# Altium schematic symbol library FPGA_Xilinx_Virtex7.SchLib: 34 symbols (part 21 of 34) (continued)
## XC7VX550T-FFG1158 (continued)
part N pins: AA1 GND (power), AA2 GND (power), AA5 GND (power), AA9 GND (power), AA11 GND (power), AA13 GND (power), AA15 GND (power), AA19 GND (power), AA21 GND (power), AA23 GND (power), AA26 GND (power), AA30 GND (power), AA33 GND (power), AA34 GND (power), AB3 GND (power), AB4 GND (power), AB7 GND (power), AB8 GND (power), AB9 GND (power), AB12 GND (power), AB14 GND (power), AB16 GND (power), AB18 GND (power), AB20 GND (power), AB22 GND (power), AB24 GND (power), AB26 GND (power), AB27 GND (power), AB28 GND (power), AB31 GND (power), AB32 GND (power), AC1 GND (power), AC5 GND (power), AC9 GND (power), AC13 GND (power), AC15 GND (power), AC17 GND (power), AC19 GND (power), AC21 GND (power), AC23 GND (power), AC25 GND (power), AC26 GND (power), AC30 GND (power), AC34 GND (power), AD4 GND (power), AD7 GND (power), AD8 GND (power), AD9 GND (power), AD10 GND (power), AD12 GND (power), AD20 GND (power), AD22 GND (power), AD24 GND (power), AD26 GND (power), AD27 GND (power), AD28 GND (power), AD31 GND (power), AE1 GND (power), AE2 GND (power), AE5 GND (power), AE9 GND (power), AE15 GND (power), AE25 GND (power), AE26 GND (power), AE30 GND (power), AE33 GND (power), AE34 GND (power), AF3 GND (power), AF4 GND (power), AF7 GND (power), AF8 GND (power), AF9 GND (power), AF12 GND (power), AF22 GND (power), AF26 GND (power), AF27 GND (power), AF28 GND (power), AF31 GND (power), AF32 GND (power), AG1 GND (power), AG5 GND (power), AG7 GND (power), AG8 GND (power), AG9 GND (power), AG19 GND (power), AG26 GND (power), AG27 GND (power), AG28 GND (power), AG30 GND (power), AG34 GND (power), AH4 GND (power), AH7 GND (power), AH8 GND (power), AH9 GND (power), AH16 GND (power), AH26 GND (power), AH27 GND (power), AH28 GND (power), AH31 GND (power), AJ1 GND (power), AJ2 GND (power), AJ5 GND (power), AJ7 GND (power), AJ13 GND (power), AJ23 GND (power), AJ28 GND (power), AJ30 GND (power), AJ33 GND (power), AJ34 GND (power), AK3 GND (power), AK4 GND (power), AK7 GND (power), AK10 GND (power), AK20 GND (power), AK28 GND (power), AK31 GND (power), AK32 GND (power), AL1 GND (power), AL5 GND (power), AL7 GND (power), AL17 GND (power), AL27 GND (power), AL28 GND (power), AL30 GND (power), AL34 GND (power), AM4 GND (power), AM7 GND (power), AM14 GND (power), AM24 GND (power), AM28 GND (power), AM31 GND (power), AN1 GND (power), AN2 GND (power), AN5 GND (power), AN7 GND (power), AN11 GND (power), AN21 GND (power), AN28 GND (power), AN30 GND (power), AN33 GND (power), AN34 GND (power), AP3 GND (power), AP4 GND (power), AP7 GND (power), AP8 GND (power), AP18 GND (power), AP28 GND (power), AP31 GND (power), AP32 GND (power), L34 GND (power), M4 GND (power), M7 GND (power), M8 GND (power), M9 GND (power), M14 GND (power), M24 GND (power), M26 GND (power), M27 GND (power), M28 GND (power), M31 GND (power), N1 GND (power), N2 GND (power), N5 GND (power), N9 GND (power), N11 GND (power), N21 GND (power), N26 GND (power), N30 GND (power), N33 GND (power), N34 GND (power), P3 GND (power), P4 GND (power), P7 GND (power), P8 GND (power), P9 GND (power), P18 GND (power), P26 GND (power), P27 GND (power), P28 GND (power), P31 GND (power), P32 GND (power), R1 GND (power), R5 GND (power), R9 GND (power), R15 GND (power), R17 GND (power), R19 GND (power), R21 GND (power), R26 GND (power), R30 GND (power), R34 GND (power), T4 GND (power), T7 GND (power), T8 GND (power), T9 GND (power), T12 GND (power), T14 GND (power), T16 GND (power), T18 GND (power), T20 GND (power), T22 GND (power), T24 GND (power), T26 GND (power), T27 GND (power), T28 GND (power), T31 GND (power), U1 GND (power), U2 GND (power), U5 GND (power), U9 GND (power), U11 GND (power), U13 GND (power), U15 GND (power), U17 GND (power), U19 GND (power), U21 GND (power), U23 GND (power), U26 GND (power), U30 GND (power), U33 GND (power), U34 GND (power), V3 GND (power), V4 GND (power), V7 GND (power), V8 GND (power), V9 GND (power), V12 GND (power), V14 GND (power), V16 GND (power), V20 GND (power), V22 GND (power), V24 GND (power), V26 GND (power), V27 GND (power), V28 GND (power), V31 GND (power), V32 GND (power), W1 GND (power), W5 GND (power), W9 GND (power), W11 GND (power), W13 GND (power), W15 GND (power), W19 GND (power), W21 GND (power), W23 GND (power), W26 GND (power), W30 GND (power), W34 GND (power), Y4 GND (power), Y7 GND (power), Y8 GND (power), Y9 GND (power), Y12 GND (power), Y14 GND (power), Y16 GND (power), Y20 GND (power), Y22 GND (power), Y24 GND (power), Y26 GND (power), Y27 GND (power), Y28 GND (power), Y31 GND (power)

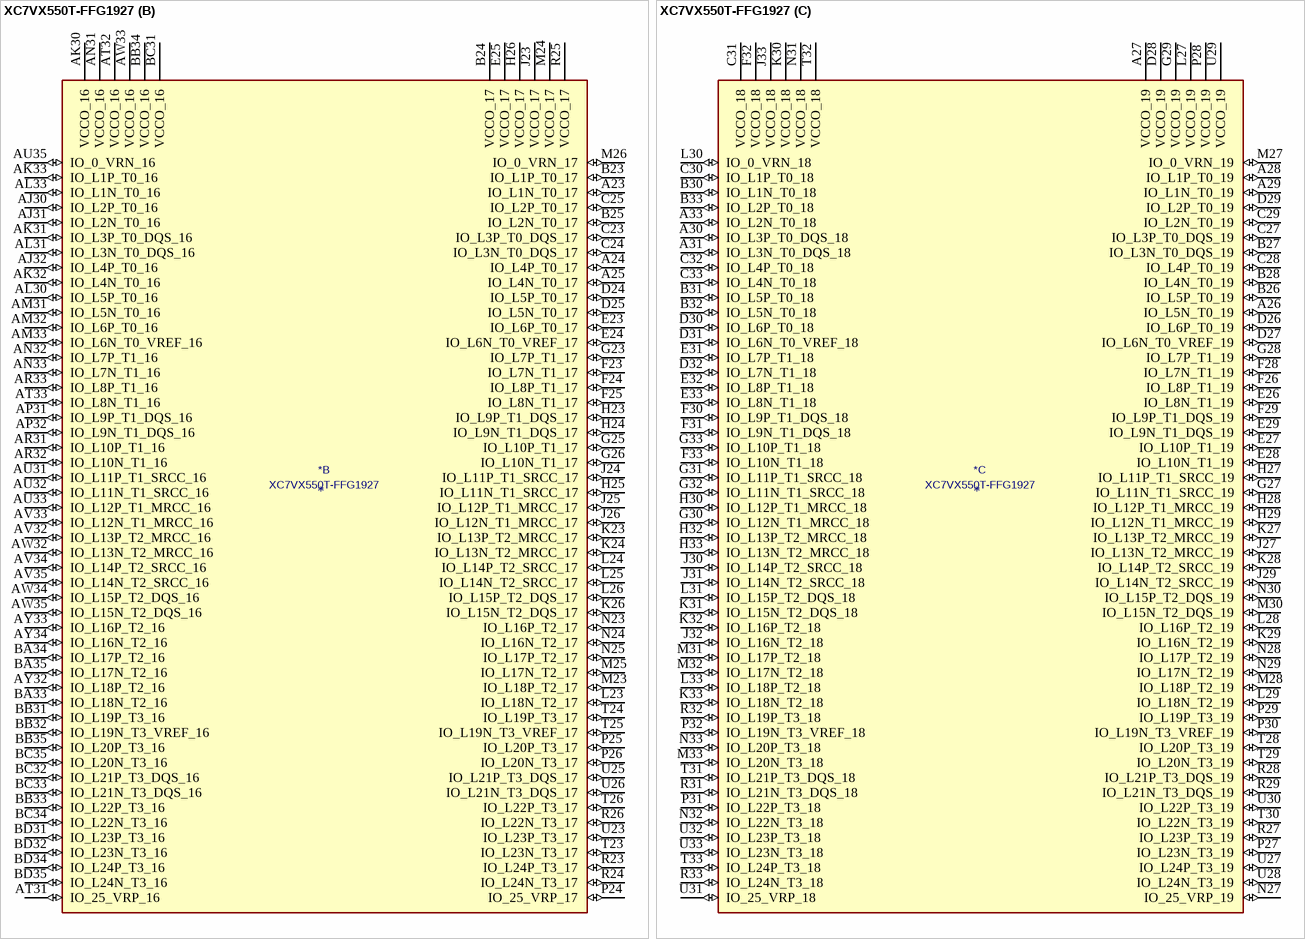
[diagram p101: symbol XC7VX550T-FFG1927]

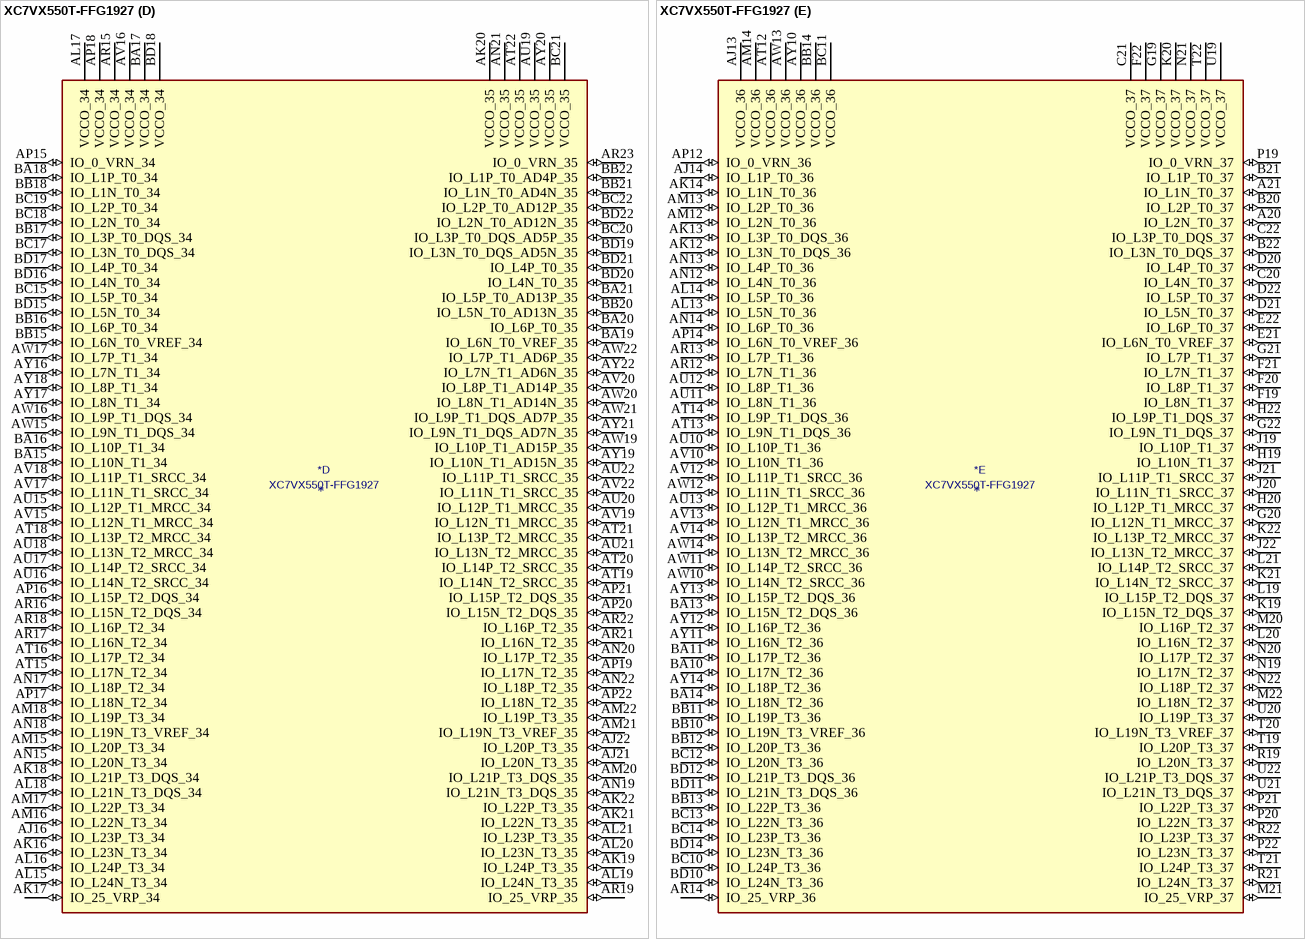
[diagram p102: symbol XC7VX550T-FFG1927]

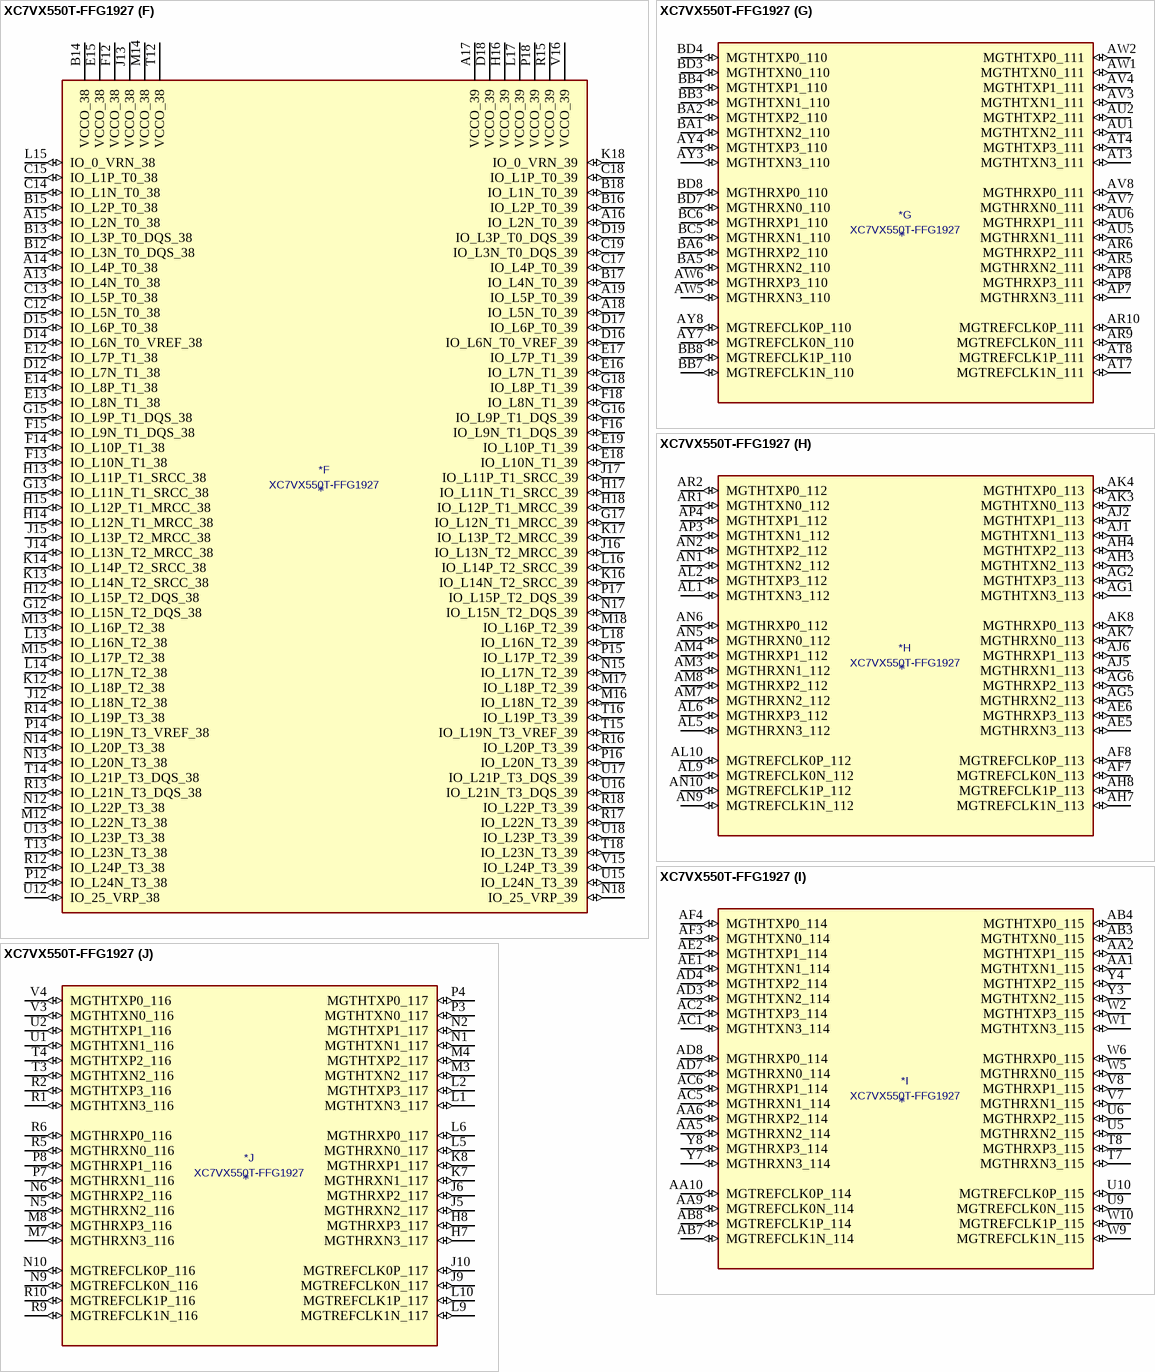
[diagram p103: symbol XC7VX550T-FFG1927]

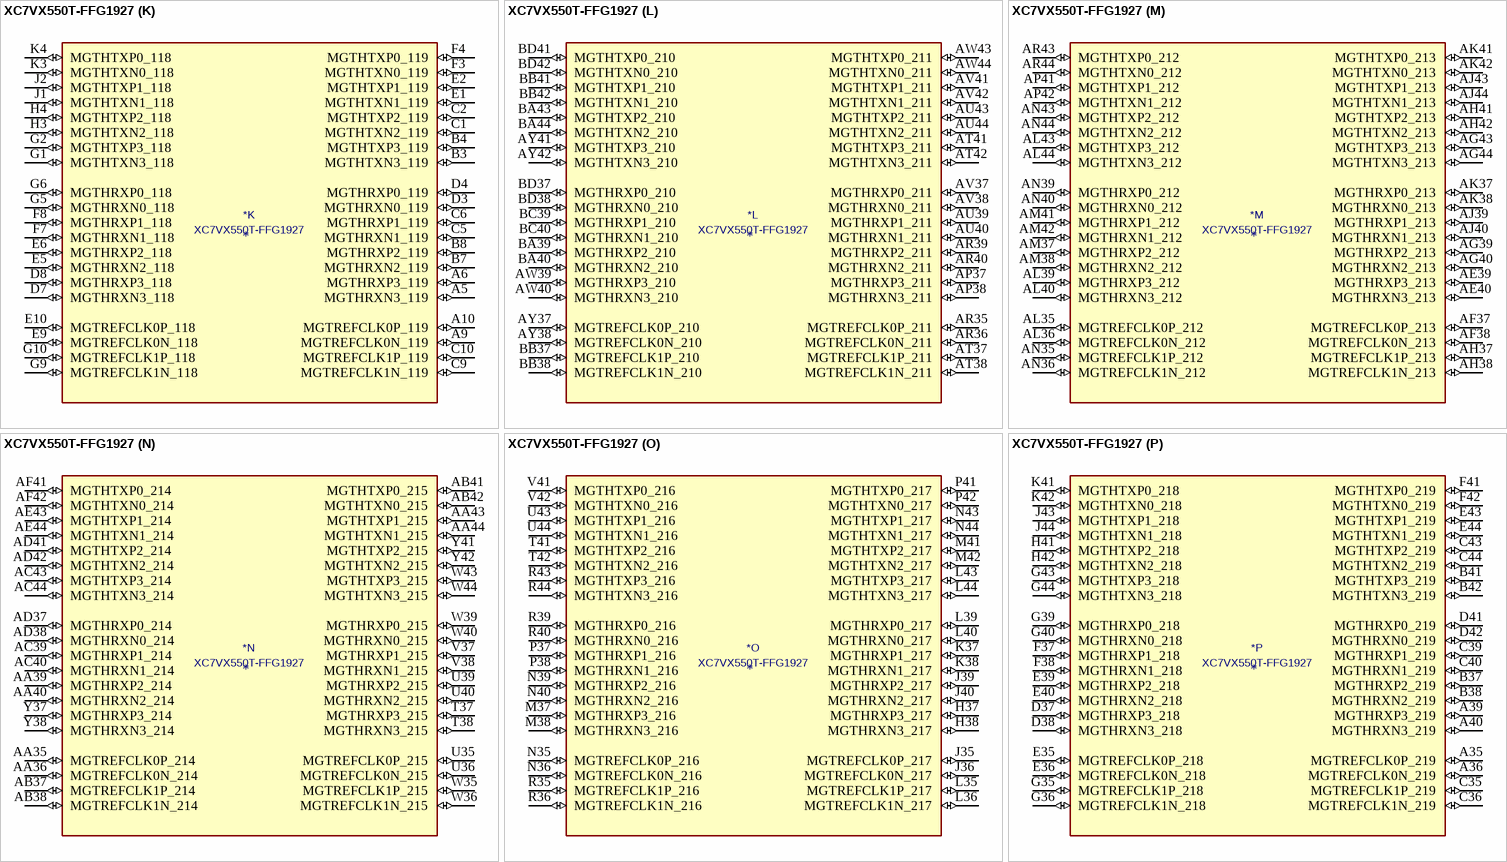
[diagram p104: symbol XC7VX550T-FFG1927]

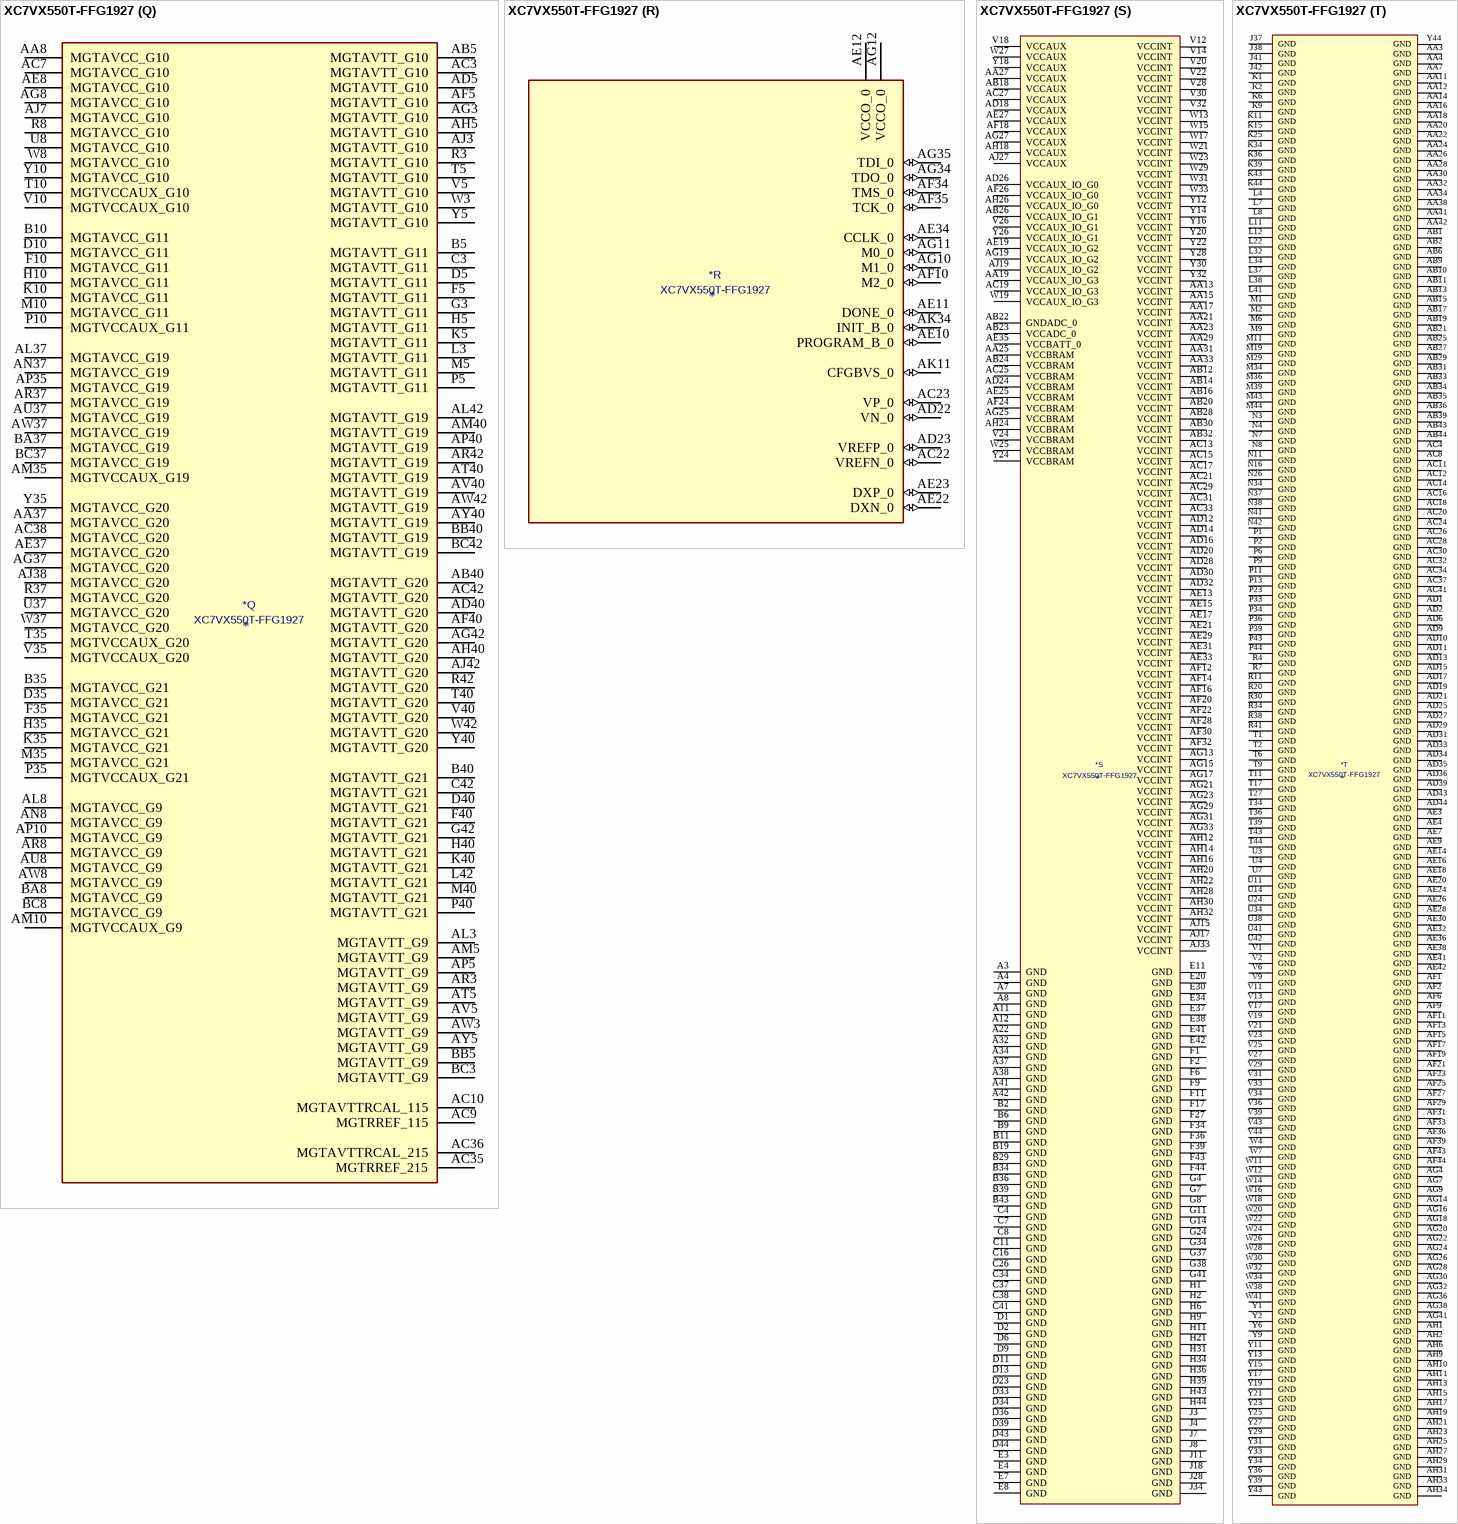
[diagram p105: symbol XC7VX550T-FFG1927]

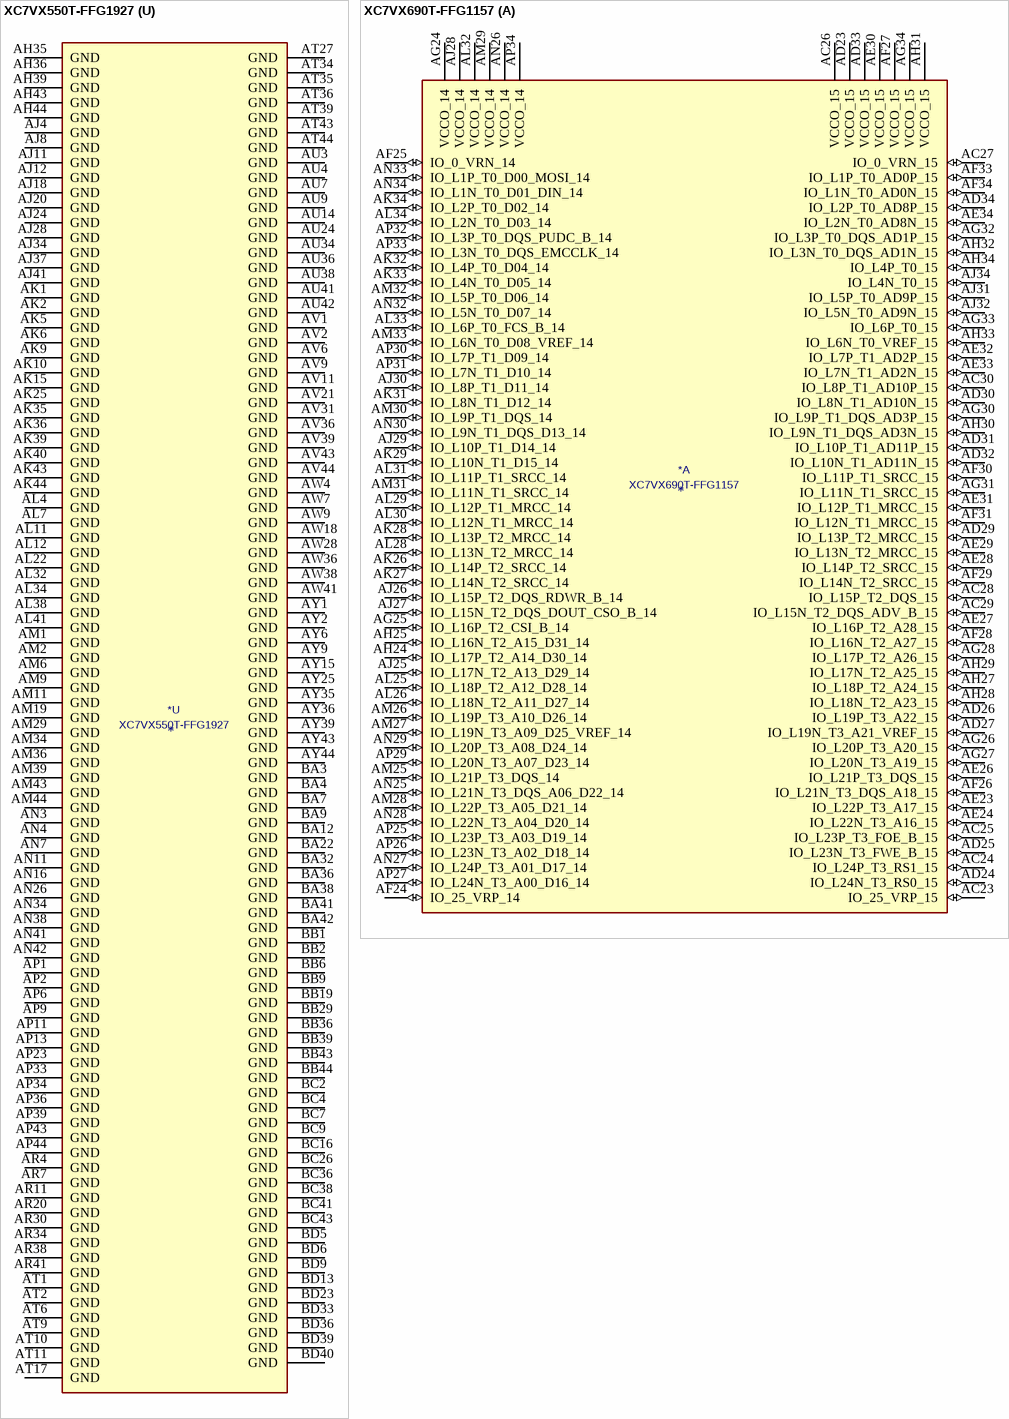
[diagram p106: symbols XC7VX550T-FFG1927 to XC7VX690T-FFG1157]